# Altium footprint library PcbLib.PcbLib: 68 footprints (part 2 of 5)
Each footprint in its own frame and in the unit in brackets; x right, y up, seen from the top. Pads: shape width x height; smd on the part's side, far side on the other; paste and mask are expansions set on the pad; w line width, h text height; cw(c..) or ccw(c..) is an arc to the next point about the centre after c.
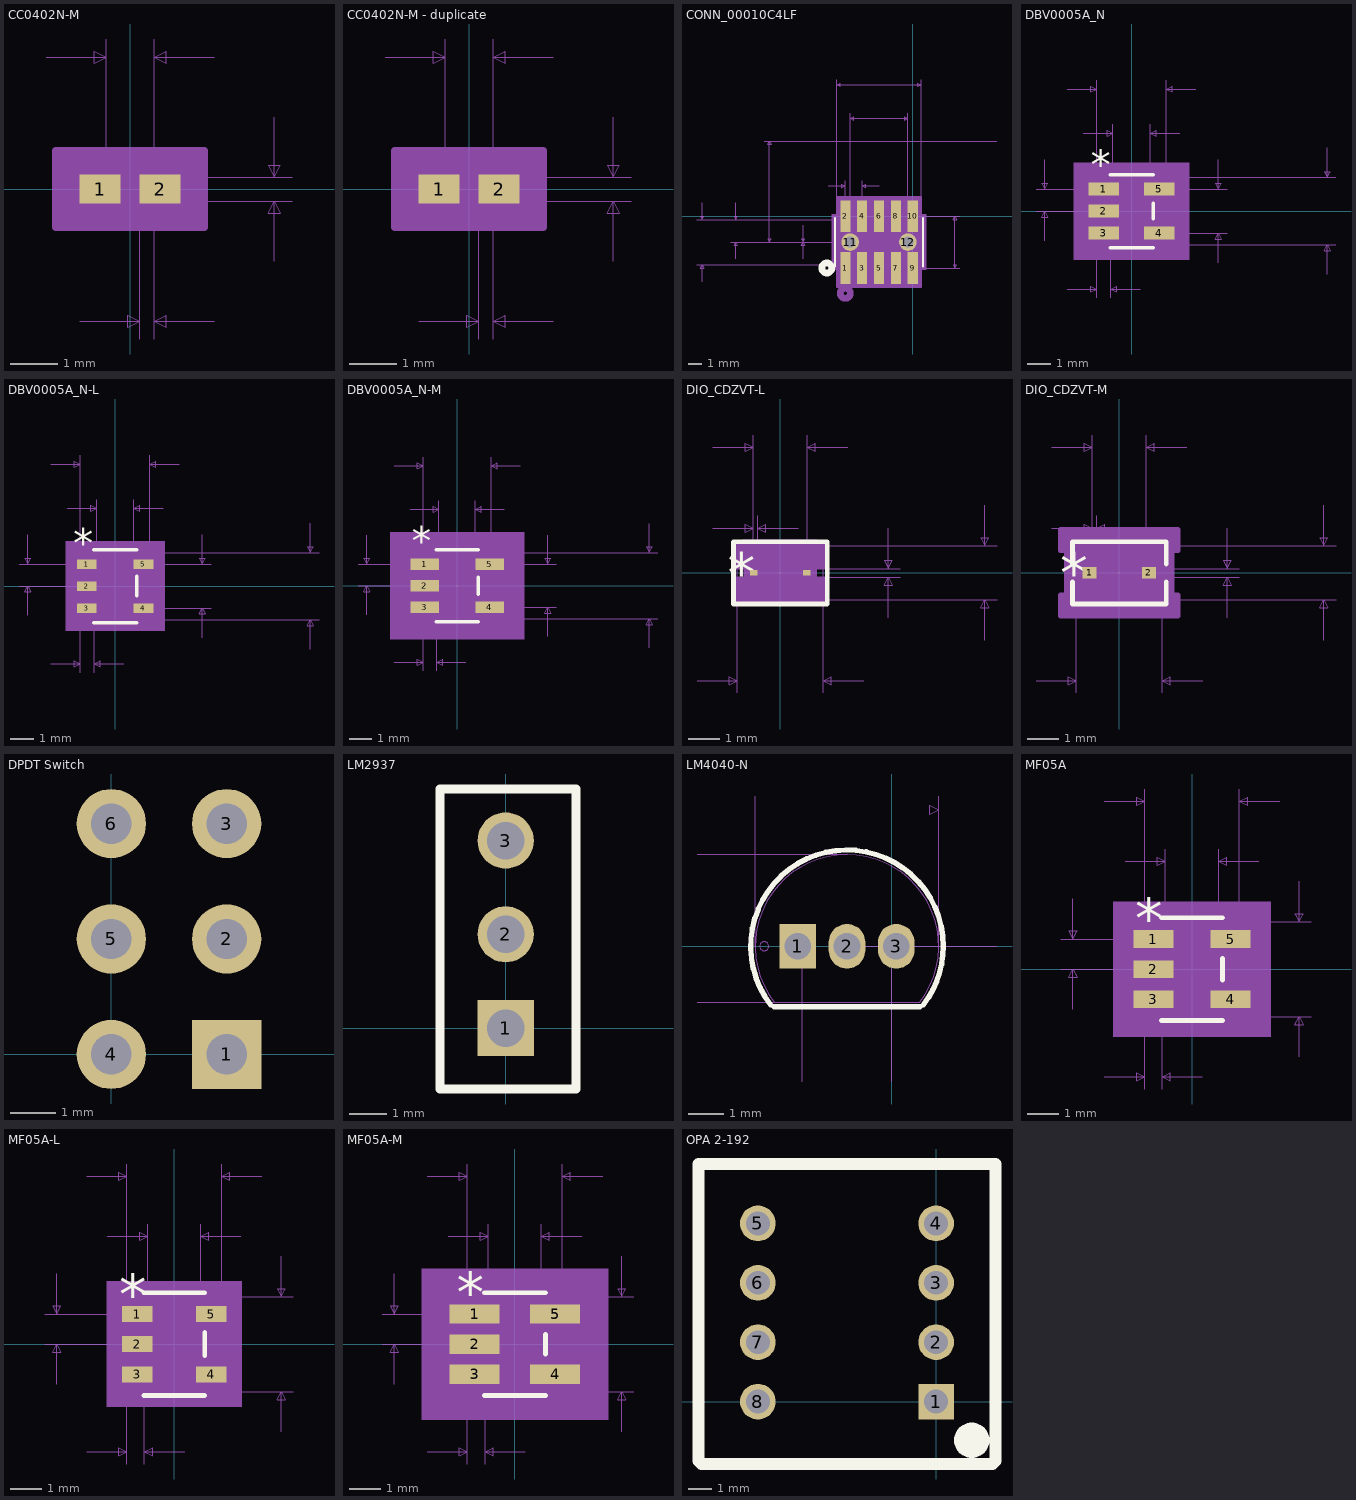
[diagram p1: the footprints below, top view; thin cyan lines are the x and y axes]

## CC0402N-M [mil]
pads (2):
  rect 34x24 smd paste+0 mask+0: 1(-25,0) 2(25,0)
Mechanical 5:
  region: 57,-27 -57,-27 -57,27 57,27
Mechanical 7:
  lines w1: -70,110 -20,110 ; -42,-110 8,-110 ; -20,0 -20,125 ; 0,-10 135,-10 ; 0,10 135,10 ; 8,-125 8,0 ; 20,-125 20,0 20,125 ; 70,-110 20,-110 ; 70,110 20,110 ; 120,-60 120,-10 ; 120,60 120,10 ; -20,110 -30,115 -30,105 -20,110 ; 8,-110 -2,-105 -2,-115 8,-110 ; 20,-110 30,-105 30,-115 20,-110 ; 20,110 30,115 30,105 20,110 ; 120,-10 115,-20 125,-20 120,-10 ; 120,10 115,20 125,20 120,10
  text "Default Padstyle: RX34Y24D0T" at -350,-282 h50
  text "Alternate 1 Padstyle: OX60Y90D30P" at -412.5,-382 h50
  text "Alternate 2 Padstyle: OX90Y60D30P" at -412.5,-482 h50
  text "0.02in/0.508mm" at 140,-12.5 h25
  text "0.04in/1.016mm" at -87.5,130 h25
  text "0.012in/0.305mm" at -79.75,-155 h25
Mechanical 13:
  lines w1: -20,-10 -20,10 ; -20,-10 -8,-10 -8,10 -20,10 ; -20,-10 20,-10 ; -20,-10 -20,10 ; -20,10 20,10 ; 20,-10 8,-10 8,10 20,10 ; 20,-10 20,10 ; 20,-10 20,10
Mechanical 15:
  region: 62,-32 -62,-32 -62,32 62,32
  lines w6: -62,-32 -62,32 62,32 62,-32 -62,-32
3D body: height 10, standoff 0, extent 0,0 10,10

## CC0402N-M - duplicate [mil]
pads (2):
  rect 34x24 smd paste+0 mask+0: 1(-25,0) 2(25,0)
Mechanical 5:
  region: 57,-27 -57,-27 -57,27 57,27
Mechanical 7:
  lines w1: -70,110 -20,110 ; -42,-110 8,-110 ; -20,0 -20,125 ; 0,-10 135,-10 ; 0,10 135,10 ; 8,-125 8,0 ; 20,-125 20,0 20,125 ; 70,-110 20,-110 ; 70,110 20,110 ; 120,-60 120,-10 ; 120,60 120,10 ; -20,110 -30,105 -30,115 -20,110 ; 8,-110 -2,-115 -2,-105 8,-110 ; 20,-110 30,-115 30,-105 20,-110 ; 20,110 30,105 30,115 20,110 ; 120,-10 125,-20 115,-20 120,-10 ; 120,10 125,20 115,20 120,10
  text "0.012in/0.305mm" at -79.75,-155 h25
  text "0.04in/1.016mm" at -87.5,130 h25
  text "0.02in/0.508mm" at 140,-12.5 h25
  text "Alternate 2 Padstyle: OX90Y60D30P" at -412.5,-482 h50
  text "Alternate 1 Padstyle: OX60Y90D30P" at -412.5,-382 h50
  text "Default Padstyle: RX34Y24D0T" at -350,-282 h50
Mechanical 13:
  lines w1: -20,-10 -20,10 ; -20,-10 20,-10 ; -20,-10 -8,-10 -8,10 -20,10 ; -20,-10 -20,10 ; -20,10 20,10 ; 20,-10 20,10 ; 20,-10 20,10 ; 20,-10 8,-10 8,10 20,10
Mechanical 15:
  region: 62,-32 -62,-32 -62,32 62,32
  lines w6: -62,-32 62,-32 62,32 -62,32 -62,-32
3D body: height 10, standoff 0, extent 0,0 10,10

## CONN_00010C4LF [mil]
pads (12):
  rect 30x94 smd paste+0 mask+0: 1(-200,-153.54) 2(-200,0) 3(-150,-153.54) 4(-150,0) 5(-100,-153.54) 6(-100,0) 7(-50,-153.54) 8(-50,0) 9(0,-153.54) 10(0,0)
  round 52 hole 32 mask+0: 11(-185.63,-76.77) 12(-14.37,-76.77)
Top Overlay:
  circle w20: c-255,-153.54 r15
  lines w6: -230,-148.77 -230,-4.77 ; 30,-148.77 30,-4.77
Bottom Overlay:
  circle w20: c-255,-153.54 r15
Mechanical 5:
  region: -240,5.23 40,5.23 40,-158.77 -240,-158.77
Mechanical 7:
  lines w1: -640,-143.77 -225,-143.77 ; -640,-9.77 -225,-9.77 ; -625,-193.77 -625,-143.77 ; -625,40.23 -625,-9.77 ; -540,-76.77 -100,-76.77 ; -540,-9.77 -225,-9.77 ; -525,-126.77 -525,-76.77 ; -525,40.23 -525,-9.77 ; -440,-76.77 -100,-76.77 ; -440,223.23 250,223.23 ; -325,-126.77 -325,-76.77 ; -325,-26.77 -325,-76.77 ; -250,90.23 -200,90.23 ; -225,405.23 -225,-9.77 ; -200,0 140,0 ; -200,105.23 -200,-153.54 140,-153.54 ; -185.63,-76.77 -185.63,305.23 ; -150,-153.54 -150,105.23 ; -100,90.23 -150,90.23 ; -14.37,305.23 -14.37,-76.77 -340,-76.77 -100,-76.77 ; 25,-9.77 25,405.23 ; -625,-143.77 -630,-153.77 -620,-153.77 -625,-143.77 ; -625,-9.77 -630,0.23 -620,0.23 -625,-9.77 ; -525,-76.77 -530,-86.77 -520,-86.77 -525,-76.77 ; -525,-9.77 -530,0.23 -520,0.23 -525,-9.77 ; -425,-76.77 -425,223.23 ; -425,-76.77 -430,-66.77 -420,-66.77 -425,-76.77 ; -425,223.23 -430,213.23 -420,213.23 -425,223.23 ; -325,-76.77 -330,-66.77 -320,-66.77 -325,-76.77 ; -325,-76.77 -330,-86.77 -320,-86.77 -325,-76.77 ; -225,390.23 25,390.23 ; -225,390.23 -215,395.23 -215,385.23 -225,390.23 ; -200,90.23 -210,95.23 -210,85.23 -200,90.23 ; -185.63,290.23 -14.37,290.23 ; -185.63,290.23 -175.63,295.23 -175.63,285.23 -185.63,290.23 ; -150,90.23 -140,95.23 -140,85.23 -150,90.23 ; -14.37,290.23 -24.37,295.23 -24.37,285.23 -14.37,290.23 ; 25,390.23 15,395.23 15,385.23 25,390.23 ; 125,-153.54 125,0 ; 125,-153.54 120,-143.54 130,-143.54 125,-153.54 ; 125,0 120,-10 130,-10 125,0
  text "Default Padstyle: RX30Y94D0T" at -450,-293.77 h50
  text "1st Mtg Padstyle: EX52Y52D32P" at -462.5,-368.77 h50
  text "2nd Mtg Padstyle: EX70Y70D70P" at -462.5,-443.77 h50
  text "3rd Mtg Padstyle: EX70Y70D70P" at -462.5,-518.77 h50
  text "Left Mtg Padstyle: EX60Y60D30P" at -475,-593.77 h50
  text "Right Mtg Padstyle: EX60Y60D30P" at -487.5,-668.77 h50
  text "Alt Padstyle 1: OX60Y90D30P" at -437.5,-743.77 h50
  text "Alt Padstyle 2: OX90Y60D30P" at -437.5,-818.77 h50
  text "0.05in/1.27mm" at -256.25,110.23 h25
  text "0.171in/4.35mm" at -187.5,310.23 h25
  text "0.25in/6.35mm" at -181.25,410.23 h25
  text "0.154in/3.9mm" at 145,-89.27 h25
  text "0in/0mm" at -432.5,-89.27 h25
  text "0.3in/7.62mm" at -595,60.73 h25
  text "0.067in/1.702mm" at -732.5,-55.77 h25
  text "0.134in/3.404mm" at -832.5,-55.77 h25
Mechanical 13:
  circle w20: c-200,-228.54 r15
  lines w1: -225,-143.77 25,-143.77 25,-9.77 -225,-9.77 -225,-143.77
Mechanical 15:
  region: 35,0.23 25,0.23 25,57 -225,57 -225,0.23 -235,0.23 -235,-153.77 -225,-153.77 -225,-210.54 25,-210.54 25,-153.77 35,-153.77
  lines w6: -235,-153.77 -235,0.23 -225,0.23 -225,57 25,57 25,0.23 35,0.23 35,-153.77 25,-153.77 25,-210.54 -225,-210.54 -225,-153.77 -235,-153.77
3D body: height 10, standoff 0, extent 0,0 10,10

## DBV0005A_N [mil]
pads (5):
  rect 52x22 smd paste+0 mask+0: 1(-47,37.4) 2(-47,0) 3(-47,-37.4) 4(47,-37.4) 5(47,37.4)
Top Overlay:
  lines w6: -36.5,-62 36.5,-62 ; -36.5,62 36.5,62 ; 36.5,-13.3 36.5,13.3
  text "*" at -69.5,54.4 h50
Mechanical 5:
  region: 98,-82 -98,-82 -98,82 98,82
Mechanical 7:
  lines w1: -162,0 -47,0 ; -162,37.4 -47,37.4 ; -147,-50 -147,0 ; -147,87.4 -147,37.4 ; -109,-132 -59,-132 ; -109,207 -59,207 ; -81.5,132 -31.5,132 ; -59,-147 -59,0 -59,222 ; -35,-147 -35,0 ; -31.5,0 -31.5,147 ; 0,-57 346.5,-57 ; 0,57 346.5,57 ; 15,-132 -35,-132 ; 31.5,0 31.5,147 ; 47,-37.4 162,-37.4 ; 47,37.4 162,37.4 ; 59,0 59,222 ; 81.5,132 31.5,132 ; 109,207 59,207 ; 147,-87.4 147,-37.4 ; 147,87.4 147,37.4 ; 331.5,-107 331.5,-57 ; 331.5,107 331.5,57 ; -147,0 -142,-10 -152,-10 -147,0 ; -147,37.4 -142,47.4 -152,47.4 -147,37.4 ; -59,-132 -69,-137 -69,-127 -59,-132 ; -59,207 -69,202 -69,212 -59,207 ; -35,-132 -25,-137 -25,-127 -35,-132 ; -31.5,132 -41.5,127 -41.5,137 -31.5,132 ; 31.5,132 41.5,127 41.5,137 31.5,132 ; 59,207 69,202 69,212 59,207 ; 147,-37.4 152,-47.4 142,-47.4 147,-37.4 ; 147,37.4 152,47.4 142,47.4 147,37.4 ; 331.5,-57 336.5,-67 326.5,-67 331.5,-57 ; 331.5,57 336.5,67 326.5,67 331.5,57
  text "0.024in/0.61mm" at -134.5,-177 h25
  text "0.075in/1.9mm" at 167,-12.5 h25
  text "0.037in/0.95mm" at -342,6.2 h25
  text "0.114in/2.896mm" at 351.5,-12.5 h25
  text "0.118in/2.997mm" at -93.75,227 h25
  text "0.063in/1.6mm" at -81.25,152 h25
  text "Alt 2 Padstyle: OX90Y60D30P" at -337.5,-557 h50
  text "Alt 1 Padstyle: OX60Y90D30P" at -337.5,-497 h50
  text "Default Padstyle: RX52Y22D0T" at -350,-257 h50
  text "Pin One Padstyle: RX52Y22D0T" at -350,-317 h50
Mechanical 13:
  lines w0: -12,57 ccw(c0,57) 12,57
  lines w1: -59,-47.4 -31.5,-47.4 -31.5,-27.4 -59,-27.4 -59,-47.4 ; -59,-10 -31.5,-10 -31.5,10 -59,10 -59,-10 ; -59,27.4 -31.5,27.4 -31.5,47.4 -59,47.4 -59,27.4 ; -31.5,-57 -31.5,57 31.5,57 31.5,-57 -31.5,-57 ; 31.5,-47.4 59,-47.4 59,-27.4 31.5,-27.4 31.5,-47.4 ; 31.5,27.4 59,27.4 59,47.4 31.5,47.4 31.5,27.4
  text "*" at -34,11.4 h50
Mechanical 15:
  region: 41.5,-67 -41.5,-67 -41.5,-52.4 -79,-52.4 -79,52.4 -41.5,52.4 -41.5,67 41.5,67 41.5,52.4 79,52.4 79,-52.4 41.5,-52.4
  lines w6: -79,-52.4 -79,52.4 -41.5,52.4 -41.5,67 41.5,67 41.5,52.4 79,52.4 79,-52.4 41.5,-52.4 41.5,-67 -41.5,-67 -41.5,-52.4 -79,-52.4
3D body: height 10, standoff 0, extent 0,0 10,10

## DBV0005A_N-L [mil]
pads (5):
  rect 33.5x16 smd paste+0 mask+0: 1(-48.25,37.4) 2(-48.25,0) 3(-48.25,-37.4) 4(48.25,-37.4) 5(48.25,37.4)
Top Overlay:
  lines w6: -36.5,-62 36.5,-62 ; -36.5,62 36.5,62 ; 36.5,-16.3 36.5,16.3
  text "*" at -70.75,48.4 h50
Mechanical 5:
  region: 84,-76 -84,-76 -84,76 84,76
Mechanical 7:
  lines w1: -163.25,0 -48.25,0 ; -163.25,37.4 -48.25,37.4 ; -148.25,-50 -148.25,0 ; -148.25,87.4 -148.25,37.4 ; -109,-132 -59,-132 ; -109,207 -59,207 ; -81.5,132 -31.5,132 ; -59,-147 -59,0 -59,222 ; -35,-147 -35,0 ; -31.5,0 -31.5,147 ; 0,-57 346.5,-57 ; 0,57 346.5,57 ; 15,-132 -35,-132 ; 31.5,0 31.5,147 ; 48.25,-37.4 163.25,-37.4 ; 48.25,37.4 163.25,37.4 ; 59,0 59,222 ; 81.5,132 31.5,132 ; 109,207 59,207 ; 148.25,-87.4 148.25,-37.4 ; 148.25,87.4 148.25,37.4 ; 331.5,-107 331.5,-57 ; 331.5,107 331.5,57 ; -148.25,0 -153.25,-10 -143.25,-10 -148.25,0 ; -148.25,37.4 -153.25,47.4 -143.25,47.4 -148.25,37.4 ; -59,-132 -69,-127 -69,-137 -59,-132 ; -59,207 -69,212 -69,202 -59,207 ; -35,-132 -25,-127 -25,-137 -35,-132 ; -31.5,132 -41.5,137 -41.5,127 -31.5,132 ; 31.5,132 41.5,137 41.5,127 31.5,132 ; 59,207 69,212 69,202 59,207 ; 148.25,-37.4 143.25,-47.4 153.25,-47.4 148.25,-37.4 ; 148.25,37.4 143.25,47.4 153.25,47.4 148.25,37.4 ; 331.5,-57 326.5,-67 336.5,-67 331.5,-57 ; 331.5,57 326.5,67 336.5,67 331.5,57
  text "Pin One Padstyle: RX33p5Y16D0T" at -375,-317 h50
  text "Default Padstyle: RX33p5Y16D0T" at -375,-257 h50
  text "Alt 1 Padstyle: OX60Y90D30P" at -337.5,-497 h50
  text "Alt 2 Padstyle: OX90Y60D30P" at -337.5,-557 h50
  text "0.063in/1.6mm" at -81.25,152 h25
  text "0.118in/2.997mm" at -93.75,227 h25
  text "0.114in/2.896mm" at 351.5,-12.5 h25
  text "0.037in/0.95mm" at -343.25,6.2 h25
  text "0.075in/1.9mm" at 168.25,-12.5 h25
  text "0.024in/0.61mm" at -134.5,-177 h25
Mechanical 13:
  lines w0: -12,57 ccw(c0,57) 12,57
  lines w1: -59,-47.4 -59,-27.4 -31.5,-27.4 -31.5,-47.4 -59,-47.4 ; -59,-10 -59,10 -31.5,10 -31.5,-10 -59,-10 ; -59,27.4 -59,47.4 -31.5,47.4 -31.5,27.4 -59,27.4 ; -31.5,-57 31.5,-57 31.5,57 -31.5,57 -31.5,-57 ; 31.5,-47.4 31.5,-27.4 59,-27.4 59,-47.4 31.5,-47.4 ; 31.5,27.4 31.5,47.4 59,47.4 59,27.4 31.5,27.4
  text "*" at -34,5.4 h50
Mechanical 15:
  region: 35.5,-61 -35.5,-61 -35.5,-43.4 -67,-43.4 -67,43.4 -35.5,43.4 -35.5,61 35.5,61 35.5,43.4 67,43.4 67,-43.4 35.5,-43.4
  lines w6: -67,-43.4 -35.5,-43.4 -35.5,-61 35.5,-61 35.5,-43.4 67,-43.4 67,43.4 35.5,43.4 35.5,61 -35.5,61 -35.5,43.4 -67,43.4 -67,-43.4
3D body: height 10, standoff 0, extent 0,0 10,10

## DBV0005A_N-M [mil]
pads (5):
  rect 49.5x20 smd paste+0 mask+0: 1(-56.25,37.4) 2(-56.25,0) 3(-56.25,-37.4) 4(56.25,-37.4) 5(56.25,37.4)
Top Overlay:
  lines w6: -36.5,-62 36.5,-62 ; -36.5,62 36.5,62 ; 36.5,-14.3 36.5,14.3
  text "*" at -78.75,52.4 h50
Mechanical 5:
  region: 116,-92 -116,-92 -116,92 116,92
Mechanical 7:
  lines w1: -171.25,0 -56.25,0 ; -171.25,37.4 -56.25,37.4 ; -156.25,-50 -156.25,0 ; -156.25,87.4 -156.25,37.4 ; -109,-132 -59,-132 ; -109,207 -59,207 ; -81.5,132 -31.5,132 ; -59,-147 -59,0 -59,222 ; -35,-147 -35,0 ; -31.5,0 -31.5,147 ; 0,-57 346.5,-57 ; 0,57 346.5,57 ; 15,-132 -35,-132 ; 31.5,0 31.5,147 ; 56.25,-37.4 171.25,-37.4 ; 56.25,37.4 171.25,37.4 ; 59,0 59,222 ; 81.5,132 31.5,132 ; 109,207 59,207 ; 156.25,-87.4 156.25,-37.4 ; 156.25,87.4 156.25,37.4 ; 331.5,-107 331.5,-57 ; 331.5,107 331.5,57 ; -156.25,0 -151.25,-10 -161.25,-10 -156.25,0 ; -156.25,37.4 -151.25,47.4 -161.25,47.4 -156.25,37.4 ; -59,-132 -69,-137 -69,-127 -59,-132 ; -59,207 -69,202 -69,212 -59,207 ; -35,-132 -25,-137 -25,-127 -35,-132 ; -31.5,132 -41.5,127 -41.5,137 -31.5,132 ; 31.5,132 41.5,127 41.5,137 31.5,132 ; 59,207 69,202 69,212 59,207 ; 156.25,-37.4 161.25,-47.4 151.25,-47.4 156.25,-37.4 ; 156.25,37.4 161.25,47.4 151.25,47.4 156.25,37.4 ; 331.5,-57 336.5,-67 326.5,-67 331.5,-57 ; 331.5,57 336.5,67 326.5,67 331.5,57
  text "0.024in/0.61mm" at -134.5,-177 h25
  text "0.075in/1.9mm" at 176.25,-12.5 h25
  text "0.037in/0.95mm" at -351.25,6.2 h25
  text "0.114in/2.896mm" at 351.5,-12.5 h25
  text "0.118in/2.997mm" at -93.75,227 h25
  text "0.063in/1.6mm" at -81.25,152 h25
  text "Alt 2 Padstyle: OX90Y60D30P" at -337.5,-557 h50
  text "Alt 1 Padstyle: OX60Y90D30P" at -337.5,-497 h50
  text "Default Padstyle: RX49p5Y20D0T" at -375,-257 h50
  text "Pin One Padstyle: RX49p5Y20D0T" at -375,-317 h50
Mechanical 13:
  lines w0: -12,57 ccw(c0,57) 12,57
  lines w1: -59,-47.4 -31.5,-47.4 -31.5,-27.4 -59,-27.4 -59,-47.4 ; -59,-10 -31.5,-10 -31.5,10 -59,10 -59,-10 ; -59,27.4 -31.5,27.4 -31.5,47.4 -59,47.4 -59,27.4 ; -31.5,-57 -31.5,57 31.5,57 31.5,-57 -31.5,-57 ; 31.5,-47.4 59,-47.4 59,-27.4 31.5,-27.4 31.5,-47.4 ; 31.5,27.4 59,27.4 59,47.4 31.5,47.4 31.5,27.4
  text "*" at -34,9.4 h50
Mechanical 15:
  region: 51.5,-77 -51.5,-77 -51.5,-67.4 -99,-67.4 -99,67.4 -51.5,67.4 -51.5,77 51.5,77 51.5,67.4 99,67.4 99,-67.4 51.5,-67.4
  lines w6: -99,-67.4 -99,67.4 -51.5,67.4 -51.5,77 51.5,77 51.5,67.4 99,67.4 99,-67.4 51.5,-67.4 51.5,-77 -51.5,-77 -51.5,-67.4 -99,-67.4
3D body: height 10, standoff 0, extent 0,0 10,10

## DIO_CDZVT-L [mil]
pads (2):
  rect 9.51x6.63 smd paste+0 mask+0: 1(-32.71,0) 2(32.71,0)
Top Overlay:
  lines w6: -58,-38.5 58,-38.5 58,38.5 -58,38.5 -58,-38.5
  text "*" at -64.96,-25 h50
Mechanical 5:
  region: 44.96,-41 -44.96,-41 -44.96,41 44.96,41
Mechanical 7:
  lines w1: -103,-133.5 -53,-133.5 ; -83.46,55.31 -33.46,55.31 ; -83.46,155.31 -33.46,155.31 ; -53,-148.5 -53,0 ; -33.46,70.31 -33.46,0 -33.46,170.31 ; -27.95,0 -27.95,70.31 ; 0,-33.5 268,-33.5 ; 0,33.5 268,33.5 ; 22.05,55.31 -27.95,55.31 ; 33.46,-5.32 148.46,-5.32 ; 33.46,0 33.46,170.31 ; 33.46,5.32 148.46,5.32 ; 53,-148.5 53,0 ; 83.46,155.31 33.46,155.31 ; 103,-133.5 53,-133.5 ; 133.46,-55.31 133.46,-5.32 ; 133.46,55.31 133.46,5.32 ; 253,-83.5 253,-33.5 ; 253,83.5 253,33.5 ; -53,-133.5 -63,-128.5 -63,-138.5 -53,-133.5 ; -33.46,55.31 -43.46,60.31 -43.46,50.31 -33.46,55.31 ; -33.46,155.31 -43.46,160.31 -43.46,150.31 -33.46,155.31 ; -27.95,55.31 -17.95,60.31 -17.95,50.31 -27.95,55.31 ; 33.46,155.31 43.46,160.31 43.46,150.31 33.46,155.31 ; 53,-133.5 63,-128.5 63,-138.5 53,-133.5 ; 133.46,-5.32 128.46,-15.31 138.46,-15.31 133.46,-5.32 ; 133.46,5.32 128.46,15.31 138.46,15.31 133.46,5.32 ; 253,-33.5 248,-43.5 258,-43.5 253,-33.5 ; 253,33.5 248,43.5 258,43.5 253,33.5
  text "Default Padstyle: RX9p51Y6p63D0T" at -400,-328.31 h50
  text "Alt 1 Padstyle: OX60Y90D30P" at -337.5,-403.31 h50
  text "Alt 2 Padstyle: OX90Y60D30P" at -337.5,-478.31 h50
  text "0.067in/1.7mm" at -81.25,175.31 h25
  text "0.006in/0.14mm" at -118.21,75.31 h25
  text "0.011in/0.27mm" at 153.46,-12.5 h25
  text "0.067in/1.702mm" at 273,-12.5 h25
  text "0.106in/2.692mm" at -93.75,-178.5 h25
Mechanical 13:
  lines w1: -53,-16.75 -36.25,-33.5 ; -53,16.75 -36.25,33.5 ; -53,-33.5 53,-33.5 53,33.5 -53,33.5 -53,-33.5 ; -53,-5.32 -53,5.32 -33.46,5.32 -33.46,-5.32 -53,-5.32 ; 33.46,-5.32 53,-5.32 53,5.32 33.46,5.32 33.46,-5.32
  text "*" at -55.5,-25 h50
Mechanical 15:
  region: -57,-7.32 -41.46,-7.32 -41.46,7.32 -57,7.32 -57,37.5 57,37.5 57,7.32 41.46,7.32 41.46,-7.32 57,-7.32 57,-37.5 -57,-37.5
  lines w6: -57,-37.5 -57,-7.32 -41.46,-7.32 -41.46,7.32 -57,7.32 -57,37.5 57,37.5 57,7.32 41.46,7.32 41.46,-7.32 57,-7.32 57,-37.5 -57,-37.5
3D body: height 10, standoff 0, extent 0,0 10,10

## DIO_CDZVT-M [mil]
pads (2):
  rect 17.51x14.63 smd paste+0 mask+0: 1(-36.71,0) 2(36.71,0)
Top Overlay:
  lines w6: -58,-11.12 -58,-38.5 58,-38.5 58,-11.12 ; -58,11.12 -58,38.5 58,38.5 58,11.12
  text "*" at -72.96,-25 h50
Mechanical 5:
  region: 52.96,-41 -52.96,-41 -52.96,41 52.96,41
Mechanical 7:
  lines w1: -103,-133.5 -53,-133.5 ; -83.46,55.31 -33.46,55.31 ; -83.46,155.31 -33.46,155.31 ; -53,-148.5 -53,0 ; -33.46,70.31 -33.46,0 -33.46,170.31 ; -27.95,0 -27.95,70.31 ; 0,-33.5 268,-33.5 ; 0,33.5 268,33.5 ; 22.05,55.31 -27.95,55.31 ; 33.46,-5.32 148.46,-5.32 ; 33.46,0 33.46,170.31 ; 33.46,5.32 148.46,5.32 ; 53,-148.5 53,0 ; 83.46,155.31 33.46,155.31 ; 103,-133.5 53,-133.5 ; 133.46,-55.31 133.46,-5.32 ; 133.46,55.31 133.46,5.32 ; 253,-83.5 253,-33.5 ; 253,83.5 253,33.5 ; -53,-133.5 -63,-138.5 -63,-128.5 -53,-133.5 ; -33.46,55.31 -43.46,50.31 -43.46,60.31 -33.46,55.31 ; -33.46,155.31 -43.46,150.31 -43.46,160.31 -33.46,155.31 ; -27.95,55.31 -17.95,50.31 -17.95,60.31 -27.95,55.31 ; 33.46,155.31 43.46,150.31 43.46,160.31 33.46,155.31 ; 53,-133.5 63,-138.5 63,-128.5 53,-133.5 ; 133.46,-5.32 138.46,-15.31 128.46,-15.31 133.46,-5.32 ; 133.46,5.32 138.46,15.31 128.46,15.31 133.46,5.32 ; 253,-33.5 258,-43.5 248,-43.5 253,-33.5 ; 253,33.5 258,43.5 248,43.5 253,33.5
  text "0.106in/2.692mm" at -93.75,-178.5 h25
  text "0.067in/1.702mm" at 273,-12.5 h25
  text "0.011in/0.27mm" at 153.46,-12.5 h25
  text "0.006in/0.14mm" at -118.21,75.31 h25
  text "0.067in/1.7mm" at -81.25,175.31 h25
  text "Alt 2 Padstyle: OX90Y60D30P" at -337.5,-482.31 h50
  text "Alt 1 Padstyle: OX60Y90D30P" at -337.5,-407.31 h50
  text "Default Padstyle: RX17p51Y14p63D0T" at -425,-332.31 h50
Mechanical 13:
  lines w1: -53,-16.75 -36.25,-33.5 ; -53,16.75 -36.25,33.5 ; -53,-33.5 -53,33.5 53,33.5 53,-33.5 -53,-33.5 ; -53,-5.32 -33.46,-5.32 -33.46,5.32 -53,5.32 -53,-5.32 ; 33.46,-5.32 33.46,5.32 53,5.32 53,-5.32 33.46,-5.32
  text "*" at -55.5,-25 h50
Mechanical 15:
  region: -73,-27.32 -65.46,-27.32 -65.46,27.32 -73,27.32 -73,53.5 73,53.5 73,27.32 65.46,27.32 65.46,-27.32 73,-27.32 73,-53.5 -73,-53.5
  lines w6: -73,-53.5 73,-53.5 73,-27.32 65.46,-27.32 65.46,27.32 73,27.32 73,53.5 -73,53.5 -73,27.32 -65.46,27.32 -65.46,-27.32 -73,-27.32 -73,-53.5
3D body: height 10, standoff 0, extent 0,0 10,10

## DPDT Switch [mil]
pads (6):
  rect 60x60 hole 35: 1(100,0)
  round 60 hole 35: 2(100,100) 3(100,200) 4(0,0) 5(0,100) 6(0,200)

## LM2937 [mil]
pads (3):
  rect 60x60 hole 40: 1(0,0)
  round 60 hole 40: 2(0,100) 3(0,200)
Top Overlay:
  region: 0,-55
  lines w10: -70,-65 75,-65 75,255 -70,255 -70,-65

## LM4040-N [mil]
pads (3):
  rect 41x50 hole 30: 1(-105,0)
  oval 41x50 hole 30: 2(-50,0) 3(5,0)
Top Overlay:
  lines w6: -135.2,-65.55 cw(c-50,0) 57.5,0 cw(c-50,0) 35.2,-65.55 ; -131.24,-67.5 31.24,-67.5
Mechanical 7:
  lines w1: -217.5,-62.5 -50,-62.5 ; -217.5,102.5 -50,102.5 ; -152.5,0 -152.5,167.5 ; -100,-151.25 -100,0 ; -40,0 117.5,0 0,0 0,-151.25 ; 52.5,0 52.5,167.5 ; 42.5,147.5 52.5,152.5 42.5,157.5 42.5,147.5
Mechanical 13:
  circle w0: c-142.5,0 r5
  lines w0: -131.24,-62.5 cw(c-50,0) 31.24,-62.5
  lines w1: -131.24,-62.5 31.24,-62.5
  lines w6: -110,0 -90,0 ; -100,-10 -100,10
3D body: height 10, standoff 0, extent 0,0 10,10

## MF05A [mil]
pads (5):
  rect 50x22 smd: 1(-48,37.5) 2(-48,0) 3(-48,-37.5) 4(48,-37.5) 5(48,37.5)
Top Overlay:
  lines w6: -38,-64 38,-64 ; -38,64 38,64 ; 38,-13.4 38,13.4
  text "*" at -70.5,38.5 h50
Mechanical 5:
  region: 98,-84 98,84 -98,84 -98,-84
Mechanical 7:
  lines w1: -163,0 -48,0 ; -163,37.5 -48,37.5 ; -148,-50 -148,0 ; -148,87.5 -148,37.5 ; -109,-134 -59,-134 ; -109,209 -59,209 ; -83,134 -33,134 ; -59,-149 -59,0 -59,224 ; -37,-149 -37,0 ; -33,0 -33,149 ; 0,-59 148,-59 ; 0,59 148,59 ; 13,-134 -37,-134 ; 33,0 33,149 ; 59,0 59,224 ; 83,134 33,134 ; 109,209 59,209 ; 133,-109 133,-59 ; 133,109 133,59 ; -148,0 -153,-10 -143,-10 -148,0 ; -148,37.5 -153,47.5 -143,47.5 -148,37.5 ; -59,-134 -69,-129 -69,-139 -59,-134 ; -59,209 -69,214 -69,204 -59,209 ; -37,-134 -27,-129 -27,-139 -37,-134 ; -33,134 -43,139 -43,129 -33,134 ; 33,134 43,139 43,129 33,134 ; 59,209 69,214 69,204 59,209 ; 133,-59 128,-69 138,-69 133,-59 ; 133,59 128,69 138,69 133,59
  text "Default Padstyle: RX50Y22D0T" at -350,-259 h50
  text "Alt 1 Padstyle: OX60Y90D30P" at -337.5,-379 h50
  text "Alt 2 Padstyle: OX90Y60D30P" at -337.5,-439 h50
  text "0.066in/1.676mm" at -93.75,154 h25
  text "0.118in/2.997mm" at -93.75,229 h25
  text "0.118in/2.997mm" at 153,-12.5 h25
  text "0.038in/0.952mm" at -355.5,6.25 h25
  text "0.022in/0.559mm" at -141.75,-179 h25
Mechanical 13:
  lines w1: -59,-47.5 -59,-27.5 -33,-27.5 -33,-47.5 -59,-47.5 ; -59,-10 -59,10 -33,10 -33,-10 -59,-10 ; -59,27.5 -59,47.5 -33,47.5 -33,27.5 -59,27.5 ; -33,-59 33,-59 33,59 -33,59 -33,-59 ; 33,-47.5 33,-27.5 59,-27.5 59,-47.5 33,-47.5 ; 33,27.5 33,47.5 59,47.5 59,27.5 33,27.5
  text "*" at -35.5,18.5 h50
Mechanical 15:
  region: 43,-69 -43,-69 -43,-52.5 -84,-52.5 -84,52.5 -43,52.5 -43,69 43,69 43,52.5 84,52.5 84,-52.5 43,-52.5
  lines w6: -84,-52.5 -43,-52.5 -43,-69 43,-69 43,-52.5 84,-52.5 84,52.5 43,52.5 43,69 -43,69 -43,52.5 -84,52.5 -84,-52.5
3D body: height 10, standoff 0, extent 0,0 10,10

## MF05A-L [mil]
pads (5):
  rect 38x20 smd paste+0 mask+0: 1(-46,37.5) 2(-46,0) 3(-46,-37.5) 4(46,-37.5) 5(46,37.5)
Top Overlay:
  lines w6: -38,-64 38,-64 ; -38,64 38,64 ; 38,-14.4 38,14.4
  text "*" at -68.5,37.5 h50
Mechanical 5:
  region: 84,-78 84,78 -84,78 -84,-78
Mechanical 7:
  lines w1: -161,0 -46,0 ; -161,37.5 -46,37.5 ; -146,-50 -146,0 ; -146,87.5 -146,37.5 ; -109,-134 -59,-134 ; -109,209 -59,209 ; -83,134 -33,134 ; -59,-149 -59,0 -59,224 ; -37,-149 -37,0 ; -33,0 -33,149 ; 0,-59 148,-59 ; 0,59 148,59 ; 13,-134 -37,-134 ; 33,0 33,149 ; 59,0 59,224 ; 83,134 33,134 ; 109,209 59,209 ; 133,-109 133,-59 ; 133,109 133,59 ; -146,0 -151,-10 -141,-10 -146,0 ; -146,37.5 -151,47.5 -141,47.5 -146,37.5 ; -59,-134 -69,-129 -69,-139 -59,-134 ; -59,209 -69,214 -69,204 -59,209 ; -37,-134 -27,-129 -27,-139 -37,-134 ; -33,134 -43,139 -43,129 -33,134 ; 33,134 43,139 43,129 33,134 ; 59,209 69,214 69,204 59,209 ; 133,-59 128,-69 138,-69 133,-59 ; 133,59 128,69 138,69 133,59
  text "Default Padstyle: RX38Y20D0T" at -350,-259 h50
  text "Alt 1 Padstyle: OX60Y90D30P" at -337.5,-379 h50
  text "Alt 2 Padstyle: OX90Y60D30P" at -337.5,-439 h50
  text "0.066in/1.676mm" at -93.75,154 h25
  text "0.118in/2.997mm" at -93.75,229 h25
  text "0.118in/2.997mm" at 153,-12.5 h25
  text "0.038in/0.952mm" at -353.5,6.25 h25
  text "0.022in/0.559mm" at -141.75,-179 h25
Mechanical 13:
  lines w1: -59,-47.5 -59,-27.5 -33,-27.5 -33,-47.5 -59,-47.5 ; -59,-10 -59,10 -33,10 -33,-10 -59,-10 ; -59,27.5 -59,47.5 -33,47.5 -33,27.5 -59,27.5 ; -33,-59 33,-59 33,59 -33,59 -33,-59 ; 33,-47.5 33,-27.5 59,-27.5 59,-47.5 33,-47.5 ; 33,27.5 33,47.5 59,47.5 59,27.5 33,27.5
  text "*" at -35.5,17.5 h50
Mechanical 15:
  region: 37,-63 -37,-63 -37,-51.5 -69,-51.5 -69,51.5 -37,51.5 -37,63 37,63 37,51.5 69,51.5 69,-51.5 37,-51.5
  lines w6: -69,-51.5 -37,-51.5 -37,-63 37,-63 37,-51.5 69,-51.5 69,51.5 37,51.5 37,63 -37,63 -37,51.5 -69,51.5 -69,-51.5
3D body: height 10, standoff 0, extent 0,0 10,10

## MF05A-M [mil]
pads (5):
  rect 62x24 smd paste+0 mask+0: 1(-50,37.5) 2(-50,0) 3(-50,-37.5) 4(50,-37.5) 5(50,37.5)
Top Overlay:
  lines w6: -38,-64 38,-64 ; -38,64 38,64 ; 38,-12.4 38,12.4
  text "*" at -72.5,39.5 h50
Mechanical 5:
  region: 116,-94 116,94 -116,94 -116,-94
Mechanical 7:
  lines w1: -165,0 -50,0 ; -165,37.5 -50,37.5 ; -150,-50 -150,0 ; -150,87.5 -150,37.5 ; -109,-134 -59,-134 ; -109,209 -59,209 ; -83,134 -33,134 ; -59,-149 -59,0 -59,224 ; -37,-149 -37,0 ; -33,0 -33,149 ; 0,-59 148,-59 ; 0,59 148,59 ; 13,-134 -37,-134 ; 33,0 33,149 ; 59,0 59,224 ; 83,134 33,134 ; 109,209 59,209 ; 133,-109 133,-59 ; 133,109 133,59 ; -150,0 -155,-10 -145,-10 -150,0 ; -150,37.5 -155,47.5 -145,47.5 -150,37.5 ; -59,-134 -69,-129 -69,-139 -59,-134 ; -59,209 -69,214 -69,204 -59,209 ; -37,-134 -27,-129 -27,-139 -37,-134 ; -33,134 -43,139 -43,129 -33,134 ; 33,134 43,139 43,129 33,134 ; 59,209 69,214 69,204 59,209 ; 133,-59 128,-69 138,-69 133,-59 ; 133,59 128,69 138,69 133,59
  text "Default Padstyle: RX62Y24D0T" at -350,-259 h50
  text "Alt 1 Padstyle: OX60Y90D30P" at -337.5,-379 h50
  text "Alt 2 Padstyle: OX90Y60D30P" at -337.5,-439 h50
  text "0.066in/1.676mm" at -93.75,154 h25
  text "0.118in/2.997mm" at -93.75,229 h25
  text "0.118in/2.997mm" at 153,-12.5 h25
  text "0.038in/0.952mm" at -357.5,6.25 h25
  text "0.022in/0.559mm" at -141.75,-179 h25
Mechanical 13:
  lines w1: -59,-47.5 -59,-27.5 -33,-27.5 -33,-47.5 -59,-47.5 ; -59,-10 -59,10 -33,10 -33,-10 -59,-10 ; -59,27.5 -59,47.5 -33,47.5 -33,27.5 -59,27.5 ; -33,-59 33,-59 33,59 -33,59 -33,-59 ; 33,-47.5 33,-27.5 59,-27.5 59,-47.5 33,-47.5 ; 33,27.5 33,47.5 59,47.5 59,27.5 33,27.5
  text "*" at -35.5,19.5 h50
Mechanical 15:
  region: 53,-79 -53,-79 -53,-69.5 -109,-69.5 -109,69.5 -53,69.5 -53,79 53,79 53,69.5 109,69.5 109,-69.5 53,-69.5
  lines w6: -109,-69.5 -53,-69.5 -53,-79 53,-79 53,-69.5 109,-69.5 109,69.5 53,69.5 53,79 -53,79 -53,69.5 -109,69.5 -109,-69.5
3D body: height 10, standoff 0, extent 0,0 10,10

## OPA192 Breakout [mil]

## OPA 2-192 [mil]
pads (9):
  rect 60x60 hole 40 square: 1(0,0)
  round 60 hole 40: 2(0,100) 3(0,200) 4(0,300) 5(-300,300) 6(-300,200) 7(-300,100) 8(-300,0)
  round 60 on Top Overlay: ""(60,-65)
Top Overlay:
  lines w20: -400,-100 -400,400 100,400 100,0 100,-100 ; -395,-105 95,-105
Mechanical 1:
  lines w10: -400,-100 -395,-105 ; 95,-105 100,-100